# Altium footprint library ICs_rus.PCBLIB: 103 footprints (part 5 of 7)
Each footprint in its own frame and in the unit in brackets; x right, y up, seen from the top. Pads: shape width x height; smd on the part's side, far side on the other; paste and mask are expansions set on the pad; w line width, h text height; cw(c..) or ccw(c..) is an arc to the next point about the centre after c.
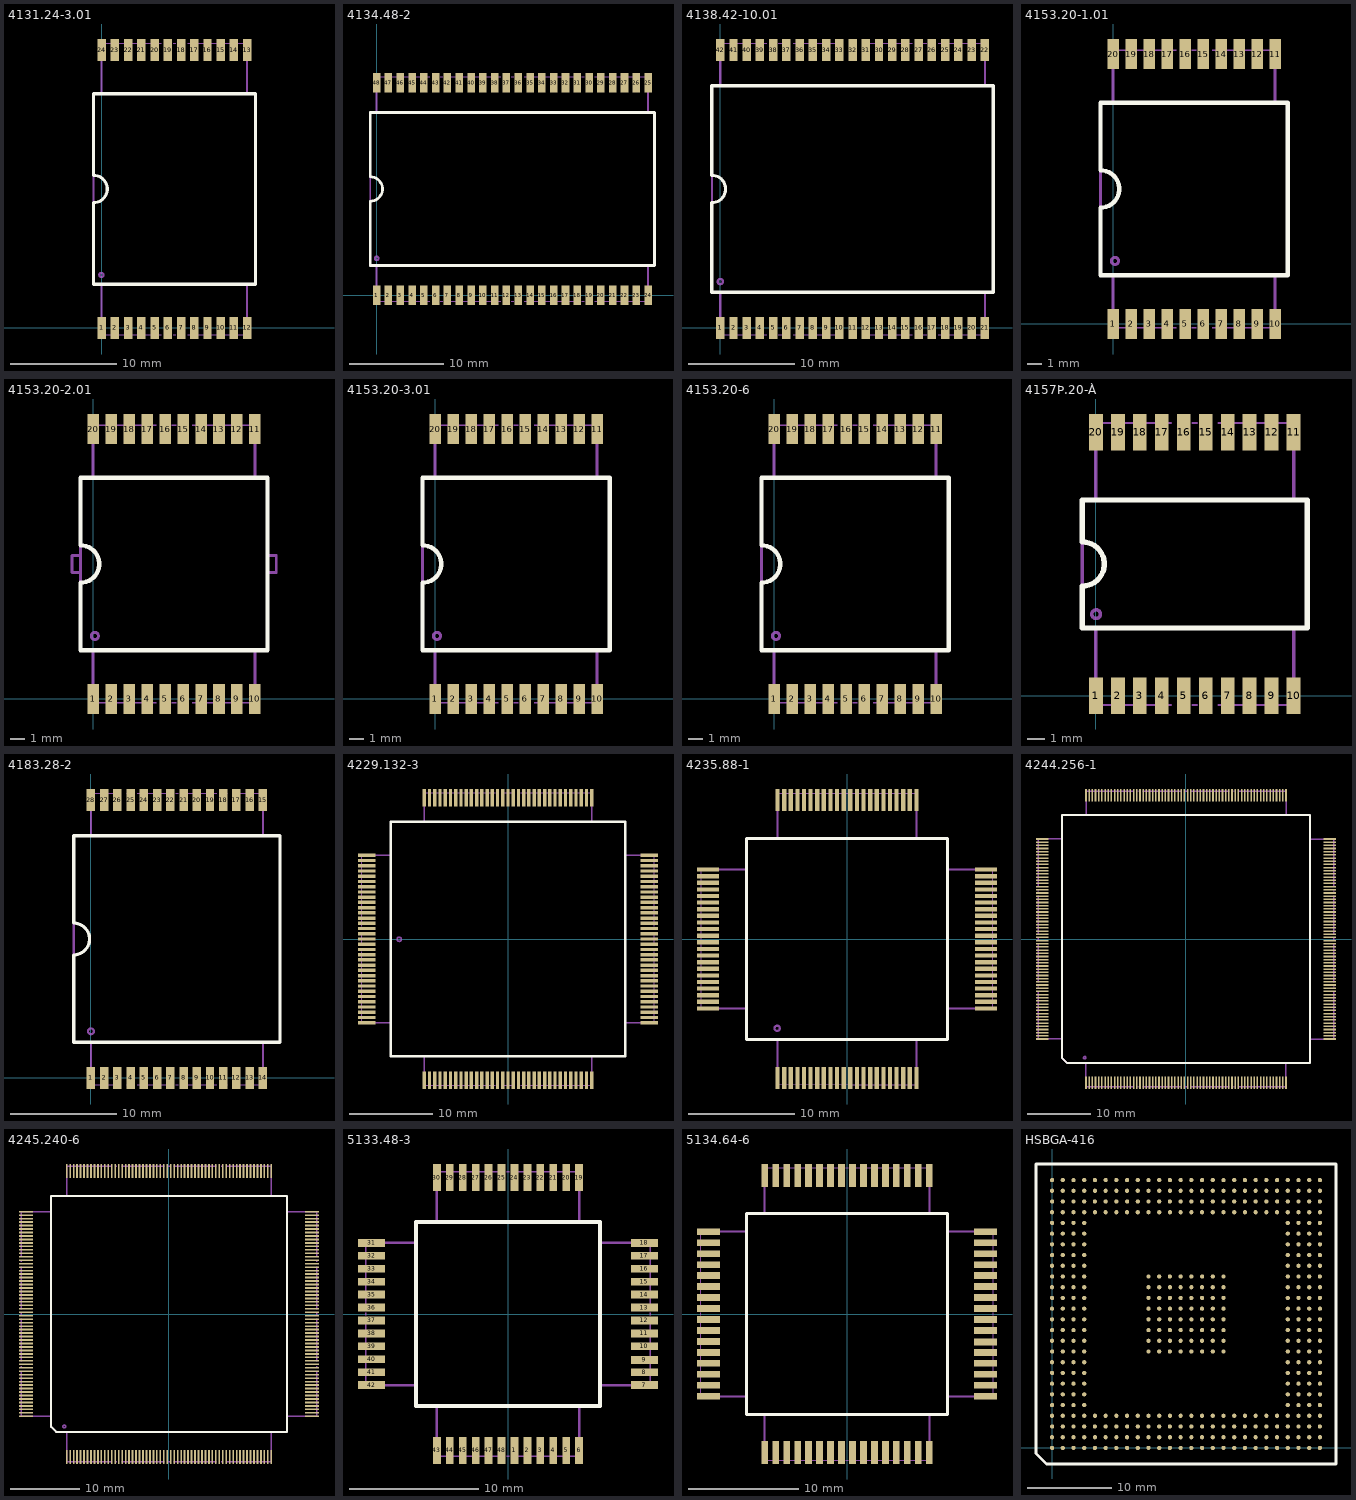
[diagram p4: the footprints below, top view; thin cyan lines are the x and y axes]

## 4131.24-3.01 [mm]
pads (24):
  rect 0.8x2.1 smd: 1(0,0) 2(1.25,0) 3(2.5,0) 4(3.75,0) 5(5,0) 6(6.25,0) 7(7.5,0) 8(8.75,0) 9(10,0) 10(11.25,0) 11(12.5,0) 12(13.75,0) 13(13.75,26.25) 14(12.5,26.25) 15(11.25,26.25) 16(10,26.25) 17(8.75,26.25) 18(7.5,26.25) 19(6.25,26.25) 20(5,26.25) 21(3.75,26.25) 22(2.5,26.25) 23(1.25,26.25) 24(0,26.25)
Top Overlay:
  lines w0.3: -0.775,4.125 14.525,4.125 14.525,22.125 -0.775,22.125 -0.775,14.425 cw(c-0.775,13.125) -0.775,11.825 -0.775,4.125
Mechanical 1:
  circle w0.2: c-0.025,5 r0.2
  lines w0.1: 0,-0.625 5.625,-0.625 ; 0,26.875 5.625,26.875 ; 6.75,-0.625 7,-0.625 ; 6.75,26.875 7,26.875 ; 8.125,-0.625 13.75,-0.625 ; 8.125,26.875 13.75,26.875
  lines w0.2: 0,-0.625 0,4.125 ; 0,22.125 0,26.875 ; 13.75,-0.625 13.75,4.125 ; 13.75,22.125 13.75,26.875 ; -0.775,4.125 14.525,4.125 14.525,22.125 -0.775,22.125 -0.775,4.125
  text ".Designator" at 5.5,14 h1.5
  text ".Comment" at 3.6,11.9 h1.5
  text "24" at 0.256,22.443 h1.5
3D body: height 3.35, standoff 0, extent -1,-0.6 14.75,26.9

## 4134.48-2 [mm]
pads (48):
  rect 0.8x2.1 smd: 1(0,0) 2(1.25,0) 3(2.5,0) 4(3.75,0) 5(5,0) 6(6.25,0) 7(7.5,0) 8(8.75,0) 9(10,0) 10(11.25,0) 11(12.5,0) 12(13.75,0) 13(15,0) 14(16.25,0) 15(17.5,0) 16(18.75,0) 17(20,0) 18(21.25,0) 19(22.5,0) 20(23.75,0) 21(25,0) 22(26.25,0) 23(27.5,0) 24(28.75,0) 25(28.75,22.5) 26(27.5,22.5) 27(26.25,22.5) 28(25,22.5) 29(23.75,22.5) 30(22.5,22.5) 31(21.25,22.5) 32(20,22.5) 33(18.75,22.5) 34(17.5,22.5) 35(16.25,22.5) 36(15,22.5) 37(13.75,22.5) 38(12.5,22.5) 39(11.25,22.5) 40(10,22.5) 41(8.75,22.5) 42(7.5,22.5) 43(6.25,22.5) 44(5,22.5) 45(3.75,22.5) 46(2.5,22.5) 47(1.25,22.5) 48(0,22.5)
Top Overlay:
  lines w0.3: -0.675,3.15 -0.675,9.95 ccw(c-0.675,11.25) -0.675,12.55 -0.675,19.35 29.425,19.35 29.425,3.15 -0.675,3.15
Mechanical 1:
  circle w0.2: c0,3.9 r0.2
  lines w0.1: 0,-0.65 5.625,-0.65 ; 0,23.15 5.625,23.15 ; 6.75,-0.65 7,-0.65 ; 6.75,23.15 7,23.15 ; 7.5,-0.65 13.125,-0.65 ; 7.5,23.15 13.125,23.15 ; 14.25,-0.65 14.5,-0.65 ; 14.25,23.15 14.5,23.15 ; 15.625,-0.65 21.25,-0.65 ; 15.625,23.15 21.25,23.15 ; 21.75,-0.65 22,-0.65 ; 21.75,23.15 22,23.15 ; 23.125,-0.65 28.75,-0.65 ; 23.125,23.15 28.75,23.15
  lines w0.2: 0,-0.65 0,3.15 ; 0,19.35 0,23.15 ; 28.75,-0.65 28.75,3.15 ; 28.75,19.35 28.75,23.15 ; -0.675,3.15 -0.675,19.35 29.425,19.35 29.425,3.15 -0.675,3.15
  text "48" at 0.427,20.446 h1.5
  text ".Comment" at 10.4,9.9 h1.5
  text ".Designator" at 12.3,12 h1.5
3D body: height 3.2, standoff 0, extent -0.9,-0.7 29.51,23.1

## 4138.42-10.01 [mm]
pads (42):
  rect 0.8x2.1 smd: 1(0,0) 2(1.25,0) 3(2.5,0) 4(3.75,0) 5(5,0) 6(6.25,0) 7(7.5,0) 8(8.75,0) 9(10,0) 10(11.25,0) 11(12.5,0) 12(13.75,0) 13(15,0) 14(16.25,0) 15(17.5,0) 16(18.75,0) 17(20,0) 18(21.25,0) 19(22.5,0) 20(23.75,0) 21(25,0) 22(25,26.25) 23(23.75,26.25) 24(22.5,26.25) 25(21.25,26.25) 26(20,26.25) 27(18.75,26.25) 28(17.5,26.25) 29(16.25,26.25) 30(15,26.25) 31(13.75,26.25) 32(12.5,26.25) 33(11.25,26.25) 34(10,26.25) 35(8.75,26.25) 36(7.5,26.25) 37(6.25,26.25) 38(5,26.25) 39(3.75,26.25) 40(2.5,26.25) 41(1.25,26.25) 42(0,26.25)
Top Overlay:
  lines w0.3: -0.8,3.375 -0.8,11.825 ccw(c-0.8,13.125) -0.8,14.425 -0.8,22.875 25.8,22.875 25.8,3.375 -0.8,3.375
Mechanical 1:
  circle w0.2: c0,4.375 r0.25
  lines w0.1: 0,-0.65 4.4,-0.65 ; 0,26.9 4.4,26.9 ; 5.5,-0.65 5.8,-0.65 ; 5.5,26.9 5.8,26.9 ; 6.875,-0.65 11.25,-0.65 ; 6.875,26.9 11.25,26.9 ; 12.35,-0.65 12.65,-0.65 ; 12.35,26.9 12.65,26.9 ; 13.75,-0.65 18.125,-0.65 ; 13.75,26.9 18.125,26.9 ; 19.2,-0.65 19.5,-0.65 ; 19.2,26.9 19.5,26.9 ; 20.6,-0.65 25,-0.65 ; 20.6,26.9 25,26.9
  lines w0.2: -0.8,22.872 25.8,22.872 ; -0.8,22.875 -0.8,3.375 25.8,3.375 25.8,22.875 ; 0,-0.625 0,3.375 ; 0,22.875 0,26.875 ; 25,-0.625 25,3.375 ; 25,22.875 25,26.875
  text "42" at 0.8,24 h1.5
  text ".Comment" at 9.3,11.7 h1.5
  text ".Designator" at 11.2,13.8 h1.5
3D body: height 2.9, standoff 0, extent -0.8,-0.6 25.72,26.9

## 4153.20-1.01 [mm]
pads (20):
  rect 0.8x2.1 smd: 1(0,0) 2(1.25,0) 3(2.5,0) 4(3.75,0) 5(5,0) 6(6.25,0) 7(7.5,0) 8(8.75,0) 9(10,0) 10(11.25,0) 11(11.25,18.75) 12(10,18.75) 13(8.75,18.75) 14(7.5,18.75) 15(6.25,18.75) 16(5,18.75) 17(3.75,18.75) 18(2.5,18.75) 19(1.25,18.75) 20(0,18.75)
Top Overlay:
  lines w0.3: -0.875,3.375 -0.875,8.075 ccw(c-0.875,9.375) -0.875,10.675 -0.875,15.375 12.125,15.375 12.125,3.375 -0.875,3.375
Mechanical 1:
  circle w0.2: c0.125,4.375 r0.25
  lines w0.1: 0,-0.275 4.375,-0.275 ; 0,19.025 4.375,19.025 ; 5.475,-0.275 5.775,-0.275 ; 5.475,19.025 5.775,19.025 ; 6.875,-0.275 11.25,-0.275 ; 6.875,19.025 11.25,19.025
  lines w0.2: 0,-0.275 0,3.375 ; 0,15.375 0,19.025 ; 11.25,-0.275 11.25,3.375 ; 11.25,15.375 11.25,19.025 ; -0.875,3.375 -0.875,15.375 12.125,15.375 12.125,3.375 -0.875,3.375
  text ".Designator" at 4.5,10.1 h1.5
  text ".Comment" at 2.6,8 h1.5
  text "20" at 0.427,16.071 h1.5
3D body: height 3, standoff 0, extent -0.9,-0.2 12.1,19.1

## 4153.20-2.01 [mm]
pads (20):
  rect 0.8x2.1 smd: 1(0,0) 2(1.25,0) 3(2.5,0) 4(3.75,0) 5(5,0) 6(6.25,0) 7(7.5,0) 8(8.75,0) 9(10,0) 10(11.25,0) 11(11.25,18.75) 12(10,18.75) 13(8.75,18.75) 14(7.5,18.75) 15(6.25,18.75) 16(5,18.75) 17(3.75,18.75) 18(2.5,18.75) 19(1.25,18.75) 20(0,18.75)
Top Overlay:
  lines w0.3: -0.875,3.375 -0.875,8.075 ccw(c-0.875,9.375) -0.875,10.675 -0.875,15.375 12.125,15.375 12.125,3.375 -0.875,3.375
Mechanical 1:
  circle w0.2: c0.125,4.375 r0.25
  lines w0.1: 0,-0.275 4.375,-0.275 ; 0,19.025 4.375,19.025 ; 5.475,-0.275 5.775,-0.275 ; 5.475,19.025 5.775,19.025 ; 6.875,-0.275 11.25,-0.275 ; 6.875,19.025 11.25,19.025
  lines w0.2: -0.875,8.775 -1.475,8.775 -1.475,9.975 -0.875,9.975 ; 0,-0.275 0,3.375 ; 0,15.375 0,19.025 ; 11.25,-0.275 11.25,3.375 ; 11.25,15.375 11.25,19.025 ; 12.125,8.775 12.725,8.775 12.725,9.975 12.125,9.975 ; -0.875,3.375 -0.875,15.375 12.125,15.375 12.125,3.375 -0.875,3.375
  text ".Designator" at 4.3,10 h1.5
  text ".Comment" at 2.4,7.9 h1.5
  text "20" at 0.751,15.618 h1.5
3D body: height 3.03, standoff 0, extent -1.5,-0.2 12.7,19.1

## 4153.20-3.01 [mm]
pads (20):
  rect 0.8x2.1 smd: 1(0,0) 2(1.25,0) 3(2.5,0) 4(3.75,0) 5(5,0) 6(6.25,0) 7(7.5,0) 8(8.75,0) 9(10,0) 10(11.25,0) 11(11.25,18.75) 12(10,18.75) 13(8.75,18.75) 14(7.5,18.75) 15(6.25,18.75) 16(5,18.75) 17(3.75,18.75) 18(2.5,18.75) 19(1.25,18.75) 20(0,18.75)
Top Overlay:
  lines w0.3: -0.875,3.375 12.125,3.375 12.125,15.375 -0.875,15.375 -0.875,10.675 cw(c-0.875,9.375) -0.875,8.075 -0.875,3.375
Mechanical 1:
  circle w0.2: c0.125,4.375 r0.25
  lines w0.1: 0,-0.275 4.375,-0.275 ; 0,19.025 4.375,19.025 ; 5.475,-0.275 5.775,-0.275 ; 5.475,19.025 5.775,19.025 ; 6.875,-0.275 11.25,-0.275 ; 6.875,19.025 11.25,19.025
  lines w0.2: 0,-0.275 0,3.375 ; 0,15.375 0,19.025 ; 11.25,-0.275 11.25,3.375 ; 11.25,15.375 11.25,19.025 ; -0.875,3.375 12.125,3.375 12.125,15.375 -0.875,15.375 -0.875,3.375
  text ".Designator" at 4.6,10.3 h1.5
  text ".Comment" at 2.7,8.2 h1.5
  text "20" at 0.751,15.618 h1.5
3D body: height 3.21, standoff 0, extent -0.9,-0.3 12.1,19

## 4153.20-6 [mm]
pads (20):
  rect 0.8x2.1 smd: 1(0,0) 2(1.25,0) 3(2.5,0) 4(3.75,0) 5(5,0) 6(6.25,0) 7(7.5,0) 8(8.75,0) 9(10,0) 10(11.25,0) 11(11.25,18.75) 12(10,18.75) 13(8.75,18.75) 14(7.5,18.75) 15(6.25,18.75) 16(5,18.75) 17(3.75,18.75) 18(2.5,18.75) 19(1.25,18.75) 20(0,18.75)
Top Overlay:
  lines w0.3: -0.875,3.375 -0.875,8.075 ccw(c-0.875,9.375) -0.875,10.675 -0.875,15.375 12.125,15.375 12.125,3.375 -0.875,3.375
Mechanical 1:
  circle w0.2: c0.125,4.375 r0.25
  lines w0.1: 0,-0.275 4.375,-0.275 ; 0,19.025 4.375,19.025 ; 5.475,-0.275 5.775,-0.275 ; 5.475,19.025 5.775,19.025 ; 6.875,-0.275 11.25,-0.275 ; 6.875,19.025 11.25,19.025
  lines w0.2: 0,-0.275 0,3.375 ; 0,15.375 0,19.025 ; 11.25,-0.275 11.25,3.375 ; 11.25,15.375 11.25,19.025 ; -0.875,3.375 -0.875,15.375 12.125,15.375 12.125,3.375 -0.875,3.375
  text "20" at 0.427,16.071 h1.5
  text ".Comment" at 2.7,8 h1.5
  text ".Designator" at 4.6,10.1 h1.5
3D body: height 2.9, standoff 0, extent -0.9,-0.3 12.1,19

## 4157Þ.20-À [mm]
pads (20):
  rect 0.8x2.1 smd: 1(0,0) 2(1.27,0) 3(2.54,0) 4(3.81,0) 5(5.08,0) 6(6.35,0) 7(7.62,0) 8(8.89,0) 9(10.16,0) 10(11.43,0) 11(11.43,15.24) 12(10.16,15.24) 13(8.89,15.24) 14(7.62,15.24) 15(6.35,15.24) 16(5.08,15.24) 17(3.81,15.24) 18(2.54,15.24) 19(1.27,15.24) 20(0,15.24)
Top Overlay:
  lines w0.3: -0.785,6.32 -0.785,3.92 12.215,3.92 12.215,11.32 -0.785,11.32 -0.785,8.92 ; -0.785,6.345 ccw(c-0.785,7.62) -0.785,8.895
Mechanical 1:
  circle w0.2: c0.015,4.72 r0.25
  lines w0.1: 0.015,-0.53 4.34,-0.53 ; 0.015,15.77 4.34,15.77 ; 5.59,-0.53 5.84,-0.53 ; 5.59,15.77 5.84,15.77 ; 7.09,-0.53 11.415,-0.53 ; 7.09,15.77 11.415,15.77
  lines w0.2: 0,-0.51 0,3.915 ; 0,11.325 0,15.75 ; 11.43,-0.51 11.43,3.915 ; 11.43,11.325 11.43,15.75 ; -0.785,3.92 12.215,3.92 12.215,11.32 -0.785,11.32 -0.785,3.92
  text ".Designator" at 4.8,8.3 h1.5
  text ".Comment" at 2.9,6.2 h1.5
  text "20" at 0.508,12.827 h1.5

## 4183.28-2 [mm]
pads (28):
  rect 0.8x2.1 smd: 1(0,0) 2(1.25,0) 3(2.5,0) 4(3.75,0) 5(5,0) 6(6.25,0) 7(7.5,0) 8(8.75,0) 9(10,0) 10(11.25,0) 11(12.5,0) 12(13.75,0) 13(15,0) 14(16.25,0) 15(16.25,26.25) 16(15,26.25) 17(13.75,26.25) 18(12.5,26.25) 19(11.25,26.25) 20(10,26.25) 21(8.75,26.25) 22(7.5,26.25) 23(6.25,26.25) 24(5,26.25) 25(3.75,26.25) 26(2.5,26.25) 27(1.25,26.25) 28(0,26.25)
Top Overlay:
  lines w0.3: -1.625,3.375 17.875,3.375 17.875,22.875 -1.625,22.875 -1.625,14.625 cw(c-1.625,13.125) -1.625,11.625 -1.625,3.375
Mechanical 1:
  circle w0.2: c0,4.4 r0.275
  lines w0.1: 0,-0.625 2.625,-0.625 ; 0,26.875 2.625,26.875 ; 3.375,-0.625 3.625,-0.625 ; 3.375,26.875 3.625,26.875 ; 4.375,-0.625 7.125,-0.625 ; 4.375,26.875 7.125,26.875 ; 8,-0.625 8.25,-0.625 ; 8,26.875 8.25,26.875 ; 9.125,-0.625 11.875,-0.625 ; 9.125,26.875 11.875,26.875 ; 12.625,-0.625 12.875,-0.625 ; 12.625,26.875 12.875,26.875 ; 13.625,-0.625 16.25,-0.625 ; 13.625,26.875 16.25,26.875
  lines w0.2: 0,-0.625 0,3.375 ; 0,22.875 0,26.875 ; 16.25,-0.625 16.25,3.375 ; 16.25,22.875 16.25,26.875 ; -1.625,3.375 17.875,3.375 17.875,22.875 -1.625,22.875 -1.625,3.375
  text "28" at -1.124,19.993 h1.5
  text ".Comment" at 4.5,12 h1.5
  text ".Designator" at 6.4,14.1 h1.5
3D body: height 3, standoff 0, extent -1.6,-0.6 17.9,26.9

## 4229.132-3 [mm]
pads (132):
  rect 2.1x0.4 smd: 1(-16.875,0) 2(-16.875,-0.625) 3(-16.875,-1.25) 4(-16.875,-1.875) 5(-16.875,-2.5) 6(-16.875,-3.125) 7(-16.875,-3.75) 8(-16.875,-4.375) 9(-16.875,-5) 10(-16.875,-5.625) 11(-16.875,-6.25) 12(-16.875,-6.875) 13(-16.875,-7.5) 14(-16.875,-8.125) 15(-16.875,-8.75) 16(-16.875,-9.375) 17(-16.875,-10) 51(16.875,-10) 52(16.875,-9.375) 53(16.875,-8.75) 54(16.875,-8.125) 55(16.875,-7.5) 56(16.875,-6.875) 57(16.875,-6.25) 58(16.875,-5.625) 59(16.875,-5) 60(16.875,-4.375) 61(16.875,-3.75) 62(16.875,-3.125) 63(16.875,-2.5) 64(16.875,-1.875) 65(16.875,-1.25) 66(16.875,-0.625) 67(16.875,0) 68(16.875,0.625) 69(16.875,1.25) 70(16.875,1.875) 71(16.875,2.5) 72(16.875,3.125) 73(16.875,3.75) 74(16.875,4.375) 75(16.875,5) 76(16.875,5.625) 77(16.875,6.25) 78(16.875,6.875) 79(16.875,7.5) 80(16.875,8.125) 81(16.875,8.75) 82(16.875,9.375) 83(16.875,10) 117(-16.875,10) 118(-16.875,9.375) 119(-16.875,8.75) 120(-16.875,8.125) 121(-16.875,7.5) 122(-16.875,6.875) 123(-16.875,6.25) 124(-16.875,5.625) 125(-16.875,5) 126(-16.875,4.375) 127(-16.875,3.75) 128(-16.875,3.125) 129(-16.875,2.5) 130(-16.875,1.875) 131(-16.875,1.25) 132(-16.875,0.625)
  rect 0.4x2.1 smd: 18(-10,-16.875) 19(-9.375,-16.875) 20(-8.75,-16.875) 21(-8.125,-16.875) 22(-7.5,-16.875) 23(-6.875,-16.875) 24(-6.25,-16.875) 25(-5.625,-16.875) 26(-5,-16.875) 27(-4.375,-16.875) 28(-3.75,-16.875) 29(-3.125,-16.875) 30(-2.5,-16.875) 31(-1.875,-16.875) 32(-1.25,-16.875) 33(-0.625,-16.875) 34(0,-16.875) 35(0.625,-16.875) 36(1.25,-16.875) 37(1.875,-16.875) 38(2.5,-16.875) 39(3.125,-16.875) 40(3.75,-16.875) 41(4.375,-16.875) 42(5,-16.875) 43(5.625,-16.875) 44(6.25,-16.875) 45(6.875,-16.875) 46(7.5,-16.875) 47(8.125,-16.875) 48(8.75,-16.875) 49(9.375,-16.875) 50(10,-16.875) 84(10,16.875) 85(9.375,16.875) 86(8.75,16.875) 87(8.125,16.875) 88(7.5,16.875) 89(6.875,16.875) 90(6.25,16.875) 91(5.625,16.875) 92(5,16.875) 93(4.375,16.875) 94(3.75,16.875) 95(3.125,16.875) 96(2.5,16.875) 97(1.875,16.875) 98(1.25,16.875) 99(0.625,16.875) 100(0,16.875) 101(-0.625,16.875) 102(-1.25,16.875) 103(-1.875,16.875) 104(-2.5,16.875) 105(-3.125,16.875) 106(-3.75,16.875) 107(-4.375,16.875) 108(-5,16.875) 109(-5.625,16.875) 110(-6.25,16.875) 111(-6.875,16.875) 112(-7.5,16.875) 113(-8.125,16.875) 114(-8.75,16.875) 115(-9.375,16.875) 116(-10,16.875)
Top Overlay:
  lines w0.3: -14,-14 -14,14 14,14 14,-14 -14,-14
Mechanical 1:
  circle w0.2: c-13,-0.04 r0.25
  lines w0.1: -17.5,-10 -17.5,-1.5 ; -17.5,-0.5 -17.5,0.5 ; -17.5,1.5 -17.5,10 ; -10,-17.5 -1.5,-17.5 ; -10,17.5 -1.5,17.5 ; -0.5,-17.5 0.5,-17.5 ; -0.5,17.5 0.5,17.5 ; 1.5,-17.5 10,-17.5 ; 1.5,17.5 10,17.5 ; 17.5,-10 17.5,-1.5 ; 17.5,-0.5 17.5,0.5 ; 17.5,1.5 17.5,10
  lines w0.2: -17.5,-10 -14,-10 ; -17.5,10 -14,10 ; -10,-17.5 -10,-14 ; -10,14 -10,17.5 ; 10,-17.5 10,-14 ; 10,14 10,17.5 ; 14,-10 17.5,-10 ; 14,10 17.5,10 ; -14,-14 -14,14 14,14 14,-14 -14,-14
  text "17" at -13.3,-10.8 h1.5
  text "117" at -13.3,9.6 h1.5
  text "50" at 9.352,-13.304 h1.5
  text "84" at 9.352,11.696 h1.5
  text "132" at -13,0.8 h1.5
  text "18" at -10.648,-13.304 h1.5
  text "116" at -12.172,11.696 h1.5
  text "51" at 11.852,-10.804 h1.5
  text "83" at 11.852,9.196 h1.5
  text ".Comment" at -3.6,-0.6 h1.5
  text ".Designator" at -1.7,1.5 h1.5
3D body: height 3.4, standoff 0, extent -17.5,-17.5 17.5,17.5

## 4235.88-1 [mm]
pads (88):
  rect 0.4x2.1 smd: 1(-6.562,-13.125) 2(-5.937,-13.125) 3(-5.312,-13.125) 4(-4.687,-13.125) 5(-4.062,-13.125) 6(-3.437,-13.125) 7(-2.812,-13.125) 8(-2.187,-13.125) 9(-1.562,-13.125) 10(-0.937,-13.125) 11(-0.312,-13.125) 12(0.313,-13.125) 13(0.938,-13.125) 14(1.563,-13.125) 15(2.188,-13.125) 16(2.813,-13.125) 17(3.438,-13.125) 18(4.063,-13.125) 19(4.688,-13.125) 20(5.313,-13.125) 21(5.938,-13.125) 22(6.563,-13.125) 45(6.563,13.125) 46(5.938,13.125) 47(5.313,13.125) 48(4.688,13.125) 49(4.063,13.125) 50(3.438,13.125) 51(2.813,13.125) 52(2.188,13.125) 53(1.563,13.125) 54(0.938,13.125) 55(0.313,13.125) 56(-0.312,13.125) 57(-0.937,13.125) 58(-1.562,13.125) 59(-2.187,13.125) 60(-2.812,13.125) 61(-3.437,13.125) 62(-4.062,13.125) 63(-4.687,13.125) 64(-5.312,13.125) 65(-5.937,13.125) 66(-6.562,13.125)
  rect 2.1x0.4 smd: 23(13.125,-6.562) 24(13.125,-5.937) 25(13.125,-5.312) 26(13.125,-4.687) 27(13.125,-4.062) 28(13.125,-3.437) 29(13.125,-2.812) 30(13.125,-2.187) 31(13.125,-1.562) 32(13.125,-0.937) 33(13.125,-0.312) 34(13.125,0.313) 35(13.125,0.938) 36(13.125,1.563) 37(13.125,2.188) 38(13.125,2.813) 39(13.125,3.438) 40(13.125,4.063) 41(13.125,4.688) 42(13.125,5.313) 43(13.125,5.938) 44(13.125,6.563) 67(-13.125,6.563) 68(-13.125,5.938) 69(-13.125,5.313) 70(-13.125,4.688) 71(-13.125,4.063) 72(-13.125,3.438) 73(-13.125,2.813) 74(-13.125,2.188) 75(-13.125,1.563) 76(-13.125,0.938) 77(-13.125,0.313) 78(-13.125,-0.312) 79(-13.125,-0.937) 80(-13.125,-1.562) 81(-13.125,-2.187) 82(-13.125,-2.812) 83(-13.125,-3.437) 84(-13.125,-4.062) 85(-13.125,-4.687) 86(-13.125,-5.312) 87(-13.125,-5.937) 88(-13.125,-6.562)
Top Overlay:
  lines w0.3: -9.5,-9.5 -9.5,9.5 9.5,9.5 9.5,-9.5 -9.5,-9.5
Mechanical 1:
  circle w0.2: c-6.6,-8.44 r0.25
  lines w0.1: -13.75,-6.562 -13.75,-0.5 ; -13.75,-0.12 -13.75,0.12 ; -13.75,0.5 -13.75,6.562 ; -6.563,-13.747 -0.5,-13.75 ; -6.562,13.75 -0.498,13.752 ; -0.12,-13.749 0.12,-13.75 ; -0.12,13.75 0.12,13.75 ; 0.5,-13.75 6.562,-13.75 ; 0.5,13.75 6.562,13.75 ; 13.75,-6.562 13.75,-0.5 ; 13.75,-0.12 13.75,0.12 ; 13.75,0.5 13.75,6.562
  lines w0.2: -13.75,-6.562 -9.5,-6.562 ; -13.75,6.562 -9.5,6.562 ; -6.562,-9.5 -6.561,-13.75 ; -6.562,9.5 -6.562,13.75 ; 6.56,-13.748 6.562,-9.5 ; 6.562,9.5 6.562,13.75 ; 9.5,-6.562 13.75,-6.562 ; 9.5,6.562 13.75,6.562 ; -9.5,-9.5 -9.5,9.5 9.5,9.5 9.5,-9.5 -9.5,-9.5
  text ".Designator" at -1.1,0.9 h1.5
  text ".Comment" at -3,-1.2 h1.5
  text "22" at 6.052,-8.804 h1.5
  text "23" at 7.5,-7 h1.5
  text "44" at 7.6,6.1 h1.5
  text "45" at 5.8,8.2 h1.5
  text "66" at -7.1,8 h1.5
  text "67" at -8.8,6.2 h1.5
  text "88" at -8.9,-6.9 h1.5
3D body: height 3.1, standoff 0, extent -13.7,-13.7 13.8,13.8

## 4244.256-1 [mm]
pads (256):
  rect 0.25x2 smd: 1(-15.75,-22.625) 2(-15.25,-22.625) 3(-14.75,-22.625) 4(-14.25,-22.625) 5(-13.75,-22.625) 6(-13.25,-22.625) 7(-12.75,-22.625) 8(-12.25,-22.625) 9(-11.75,-22.625) 10(-11.25,-22.625) 11(-10.75,-22.625) 12(-10.25,-22.625) 13(-9.75,-22.625) 14(-9.25,-22.625) 15(-8.75,-22.625) 16(-8.25,-22.625) 17(-7.75,-22.625) 18(-7.25,-22.625) 19(-6.75,-22.625) 20(-6.25,-22.625) 21(-5.75,-22.625) 22(-5.25,-22.625) 23(-4.75,-22.625) 24(-4.25,-22.625) 25(-3.75,-22.625) 26(-3.25,-22.625) 27(-2.75,-22.625) 28(-2.25,-22.625) 29(-1.75,-22.625) 30(-1.25,-22.625) 31(-0.75,-22.625) 32(-0.25,-22.625) 33(0.25,-22.625) 34(0.75,-22.625) 35(1.25,-22.625) 36(1.75,-22.625) 37(2.25,-22.625) 38(2.75,-22.625) 39(3.25,-22.625) 40(3.75,-22.625) 41(4.25,-22.625) 42(4.75,-22.625) 43(5.25,-22.625) 44(5.75,-22.625) 45(6.25,-22.625) 46(6.75,-22.625) 47(7.25,-22.625) 48(7.75,-22.625) 49(8.25,-22.625) 50(8.75,-22.625) 51(9.25,-22.625) 52(9.75,-22.625) 53(10.25,-22.625) 54(10.75,-22.625) 55(11.25,-22.625) 56(11.75,-22.625) 57(12.25,-22.625) 58(12.75,-22.625) 59(13.25,-22.625) 60(13.75,-22.625) 61(14.25,-22.625) 62(14.75,-22.625) 63(15.25,-22.625) 64(15.75,-22.625) 129(15.75,22.625) 130(15.25,22.625) 131(14.75,22.625) 132(14.25,22.625) 133(13.75,22.625) 134(13.25,22.625) 135(12.75,22.625) 136(12.25,22.625) 137(11.75,22.625) 138(11.25,22.625) 139(10.75,22.625) 140(10.25,22.625) 141(9.75,22.625) 142(9.25,22.625) 143(8.75,22.625) 144(8.25,22.625) 145(7.75,22.625) 146(7.25,22.625) 147(6.75,22.625) 148(6.25,22.625) 149(5.75,22.625) 150(5.25,22.625) 151(4.75,22.625) 152(4.25,22.625) 153(3.75,22.625) 154(3.25,22.625) 155(2.75,22.625) 156(2.25,22.625) 157(1.75,22.625) 158(1.25,22.625) 159(0.75,22.625) 160(0.25,22.625) 161(-0.25,22.625) 162(-0.75,22.625) 163(-1.25,22.625) 164(-1.75,22.625) 165(-2.25,22.625) 166(-2.75,22.625) 167(-3.25,22.625) 168(-3.75,22.625) 169(-4.25,22.625) 170(-4.75,22.625) 171(-5.25,22.625) 172(-5.75,22.625) 173(-6.25,22.625) 174(-6.75,22.625) 175(-7.25,22.625) 176(-7.75,22.625) 177(-8.25,22.625) 178(-8.75,22.625) 179(-9.25,22.625) 180(-9.75,22.625) 181(-10.25,22.625) 182(-10.75,22.625) 183(-11.25,22.625) 184(-11.75,22.625) 185(-12.25,22.625) 186(-12.75,22.625) 187(-13.25,22.625) 188(-13.75,22.625) 189(-14.25,22.625) 190(-14.75,22.625) 191(-15.25,22.625) 192(-15.75,22.625)
  rect 2x0.25 smd: 65(22.625,-15.75) 66(22.625,-15.25) 67(22.625,-14.75) 68(22.625,-14.25) 69(22.625,-13.75) 70(22.625,-13.25) 71(22.625,-12.75) 72(22.625,-12.25) 73(22.625,-11.75) 74(22.625,-11.25) 75(22.625,-10.75) 76(22.625,-10.25) 77(22.625,-9.75) 78(22.625,-9.25) 79(22.625,-8.75) 80(22.625,-8.25) 81(22.625,-7.75) 82(22.625,-7.25) 83(22.625,-6.75) 84(22.625,-6.25) 85(22.625,-5.75) 86(22.625,-5.25) 87(22.625,-4.75) 88(22.625,-4.25) 89(22.625,-3.75) 90(22.625,-3.25) 91(22.625,-2.75) 92(22.625,-2.25) 93(22.625,-1.75) 94(22.625,-1.25) 95(22.625,-0.75) 96(22.625,-0.25) 97(22.625,0.25) 98(22.625,0.75) 99(22.625,1.25) 100(22.625,1.75) 101(22.625,2.25) 102(22.625,2.75) 103(22.625,3.25) 104(22.625,3.75) 105(22.625,4.25) 106(22.625,4.75) 107(22.625,5.25) 108(22.625,5.75) 109(22.625,6.25) 110(22.625,6.75) 111(22.625,7.25) 112(22.625,7.75) 113(22.625,8.25) 114(22.625,8.75) 115(22.625,9.25) 116(22.625,9.75) 117(22.625,10.25) 118(22.625,10.75) 119(22.625,11.25) 120(22.625,11.75) 121(22.625,12.25) 122(22.625,12.75) 123(22.625,13.25) 124(22.625,13.75) 125(22.625,14.25) 126(22.625,14.75) 127(22.625,15.25) 128(22.625,15.75) 193(-22.625,15.75) 194(-22.625,15.25) 195(-22.625,14.75) 196(-22.625,14.25) 197(-22.625,13.75) 198(-22.625,13.25) 199(-22.625,12.75) 200(-22.625,12.25) 201(-22.625,11.75) 202(-22.625,11.25) 203(-22.625,10.75) 204(-22.625,10.25) 205(-22.625,9.75) 206(-22.625,9.25) 207(-22.625,8.75) 208(-22.625,8.25) 209(-22.625,7.75) 210(-22.625,7.25) 211(-22.625,6.75) 212(-22.625,6.25) 213(-22.625,5.75) 214(-22.625,5.25) 215(-22.625,4.75) 216(-22.625,4.25) 217(-22.625,3.75) 218(-22.625,3.25) 219(-22.625,2.75) 220(-22.625,2.25) 221(-22.625,1.75) 222(-22.625,1.25) 223(-22.625,0.75) 224(-22.625,0.25) 225(-22.625,-0.25) 226(-22.625,-0.75) 227(-22.625,-1.25) 228(-22.625,-1.75) 229(-22.625,-2.25) 230(-22.625,-2.75) 231(-22.625,-3.25) 232(-22.625,-3.75) 233(-22.625,-4.25) 234(-22.625,-4.75) 235(-22.625,-5.25) 236(-22.625,-5.75) 237(-22.625,-6.25) 238(-22.625,-6.75) 239(-22.625,-7.25) 240(-22.625,-7.75) 241(-22.625,-8.25) 242(-22.625,-8.75) 243(-22.625,-9.25) 244(-22.625,-9.75) 245(-22.625,-10.25) 246(-22.625,-10.75) 247(-22.625,-11.25) 248(-22.625,-11.75) 249(-22.625,-12.25) 250(-22.625,-12.75) 251(-22.625,-13.25) 252(-22.625,-13.75) 253(-22.625,-14.25) 254(-22.625,-14.75) 255(-22.625,-15.25) 256(-22.625,-15.75)
Top Overlay:
  lines w0.3: 19.5,19.5 -19.5,19.5 -19.5,-18.75 -18.75,-19.5 19.5,-19.5 19.5,19.5 ; 19.5,19.5 19.5,19.5
Mechanical 1:
  lines w0.2: -23.251,-8.3 -23.261,-15.75 -19.5,-15.75 ; -23.251,8.3 -23.261,15.751 -19.5,15.751 ; -23.25,-7.6 -23.25,-7.5 ; -23.25,-6.8 -23.25,-0.7 ; -23.25,-0.1 -23.25,0.1 ; -23.25,0.7 -23.25,6.8 ; -23.25,7.5 -23.25,7.6 ; -15.751,-19.5 -15.751,-23.261 -8.3,-23.251 ; -15.75,19.5 -15.75,23.261 -8.3,23.251 ; -7.6,-23.25 -7.5,-23.25 ; -7.6,23.25 -7.5,23.25 ; -6.8,-23.25 -0.7,-23.25 ; -6.8,23.25 -0.7,23.25 ; -0.1,-23.25 0.1,-23.25 ; -0.1,23.25 0.1,23.25 ; 0.7,-23.25 6.8,-23.25 ; 0.7,23.25 6.8,23.25 ; 7.5,-23.25 7.6,-23.25 ; 7.5,23.25 7.6,23.25 ; 8.3,-23.251 15.75,-23.261 15.75,-19.5 ; 8.3,23.251 15.751,23.261 15.751,19.5 ; 19.5,-15.751 23.261,-15.751 23.251,-8.3 ; 19.5,15.75 23.261,15.75 23.251,8.3 ; 23.25,-7.6 23.25,-7.5 ; 23.25,-6.8 23.25,-0.7 ; 23.25,-0.1 23.25,0.1 ; 23.25,0.7 23.25,6.8 ; 23.25,7.5 23.25,7.6 ; -19.5,-18.75 -18.75,-19.5 19.5,-19.5 19.5,19.5 -19.5,19.5 -19.5,-18.75 ; -15.75,-18.7 ccw(c-15.95,-18.7) -15.75,-18.7
  text ".Designator" at -1.43,0.905 h1.5
  text ".Comment" at -3.02,-0.795 h1.5
  text "256" at -18.55,-15.95 h1.5

## 4245.240-6 [mm]
height 4.3
pads (240):
  rect 0.25x2 smd: 1(-14.75,-20.625) 2(-14.25,-20.625) 3(-13.75,-20.625) 4(-13.25,-20.625) 5(-12.75,-20.625) 6(-12.25,-20.625) 7(-11.75,-20.625) 8(-11.25,-20.625) 9(-10.75,-20.625) 10(-10.25,-20.625) 11(-9.75,-20.625) 12(-9.25,-20.625) 13(-8.75,-20.625) 14(-8.25,-20.625) 15(-7.75,-20.625) 16(-7.25,-20.625) 17(-6.75,-20.625) 18(-6.25,-20.625) 19(-5.75,-20.625) 20(-5.25,-20.625) 21(-4.75,-20.625) 22(-4.25,-20.625) 23(-3.75,-20.625) 24(-3.25,-20.625) 25(-2.75,-20.625) 26(-2.25,-20.625) 27(-1.75,-20.625) 28(-1.25,-20.625) 29(-0.75,-20.625) 30(-0.25,-20.625) 31(0.25,-20.625) 32(0.75,-20.625) 33(1.25,-20.625) 34(1.75,-20.625) 35(2.25,-20.625) 36(2.75,-20.625) 37(3.25,-20.625) 38(3.75,-20.625) 39(4.25,-20.625) 40(4.75,-20.625) 41(5.25,-20.625) 42(5.75,-20.625) 43(6.25,-20.625) 44(6.75,-20.625) 45(7.25,-20.625) 46(7.75,-20.625) 47(8.25,-20.625) 48(8.75,-20.625) 49(9.25,-20.625) 50(9.75,-20.625) 51(10.25,-20.625) 52(10.75,-20.625) 53(11.25,-20.625) 54(11.75,-20.625) 55(12.25,-20.625) 56(12.75,-20.625) 57(13.25,-20.625) 58(13.75,-20.625) 59(14.25,-20.625) 60(14.75,-20.625) 121(14.75,20.625) 122(14.25,20.625) 123(13.75,20.625) 124(13.25,20.625) 125(12.75,20.625) 126(12.25,20.625) 127(11.75,20.625) 128(11.25,20.625) 129(10.75,20.625) 130(10.25,20.625) 131(9.75,20.625) 132(9.25,20.625) 133(8.75,20.625) 134(8.25,20.625) 135(7.75,20.625) 136(7.25,20.625) 137(6.75,20.625) 138(6.25,20.625) 139(5.75,20.625) 140(5.25,20.625) 141(4.75,20.625) 142(4.25,20.625) 143(3.75,20.625) 144(3.25,20.625) 145(2.75,20.625) 146(2.25,20.625) 147(1.75,20.625) 148(1.25,20.625) 149(0.75,20.625) 150(0.25,20.625) 151(-0.25,20.625) 152(-0.75,20.625) 153(-1.25,20.625) 154(-1.75,20.625) 155(-2.25,20.625) 156(-2.75,20.625) 157(-3.25,20.625) 158(-3.75,20.625) 159(-4.25,20.625) 160(-4.75,20.625) 161(-5.25,20.625) 162(-5.75,20.625) 163(-6.25,20.625) 164(-6.75,20.625) 165(-7.25,20.625) 166(-7.75,20.625) 167(-8.25,20.625) 168(-8.75,20.625) 169(-9.25,20.625) 170(-9.75,20.625) 171(-10.25,20.625) 172(-10.75,20.625) 173(-11.25,20.625) 174(-11.75,20.625) 175(-12.25,20.625) 176(-12.75,20.625) 177(-13.25,20.625) 178(-13.75,20.625) 179(-14.25,20.625) 180(-14.75,20.625)
  rect 2x0.25 smd: 61(20.625,-14.75) 62(20.625,-14.25) 63(20.625,-13.75) 64(20.625,-13.25) 65(20.625,-12.75) 66(20.625,-12.25) 67(20.625,-11.75) 68(20.625,-11.25) 69(20.625,-10.75) 70(20.625,-10.25) 71(20.625,-9.75) 72(20.625,-9.25) 73(20.625,-8.75) 74(20.625,-8.25) 75(20.625,-7.75) 76(20.625,-7.25) 77(20.625,-6.75) 78(20.625,-6.25) 79(20.625,-5.75) 80(20.625,-5.25) 81(20.625,-4.75) 82(20.625,-4.25) 83(20.625,-3.75) 84(20.625,-3.25) 85(20.625,-2.75) 86(20.625,-2.25) 87(20.625,-1.75) 88(20.625,-1.25) 89(20.625,-0.75) 90(20.625,-0.25) 91(20.625,0.25) 92(20.625,0.75) 93(20.625,1.25) 94(20.625,1.75) 95(20.625,2.25) 96(20.625,2.75) 97(20.625,3.25) 98(20.625,3.75) 99(20.625,4.25) 100(20.625,4.75) 101(20.625,5.25) 102(20.625,5.75) 103(20.625,6.25) 104(20.625,6.75) 105(20.625,7.25) 106(20.625,7.75) 107(20.625,8.25) 108(20.625,8.75) 109(20.625,9.25) 110(20.625,9.75) 111(20.625,10.25) 112(20.625,10.75) 113(20.625,11.25) 114(20.625,11.75) 115(20.625,12.25) 116(20.625,12.75) 117(20.625,13.25) 118(20.625,13.75) 119(20.625,14.25) 120(20.625,14.75) 181(-20.625,14.75) 182(-20.625,14.25) 183(-20.625,13.75) 184(-20.625,13.25) 185(-20.625,12.75) 186(-20.625,12.25) 187(-20.625,11.75) 188(-20.625,11.25) 189(-20.625,10.75) 190(-20.625,10.25) 191(-20.625,9.75) 192(-20.625,9.25) 193(-20.625,8.75) 194(-20.625,8.25) 195(-20.625,7.75) 196(-20.625,7.25) 197(-20.625,6.75) 198(-20.625,6.25) 199(-20.625,5.75) 200(-20.625,5.25) 201(-20.625,4.75) 202(-20.625,4.25) 203(-20.625,3.75) 204(-20.625,3.25) 205(-20.625,2.75) 206(-20.625,2.25) 207(-20.625,1.75) 208(-20.625,1.25) 209(-20.625,0.75) 210(-20.625,0.25) 211(-20.625,-0.25) 212(-20.625,-0.75) 213(-20.625,-1.25) 214(-20.625,-1.75) 215(-20.625,-2.25) 216(-20.625,-2.75) 217(-20.625,-3.25) 218(-20.625,-3.75) 219(-20.625,-4.25) 220(-20.625,-4.75) 221(-20.625,-5.25) 222(-20.625,-5.75) 223(-20.625,-6.25) 224(-20.625,-6.75) 225(-20.625,-7.25) 226(-20.625,-7.75) 227(-20.625,-8.25) 228(-20.625,-8.75) 229(-20.625,-9.25) 230(-20.625,-9.75) 231(-20.625,-10.25) 232(-20.625,-10.75) 233(-20.625,-11.25) 234(-20.625,-11.75) 235(-20.625,-12.25) 236(-20.625,-12.75) 237(-20.625,-13.25) 238(-20.625,-13.75) 239(-20.625,-14.25) 240(-20.625,-14.75)
Top Overlay:
  lines w0.3: -17,-16.25 -17,17 17,17 17,-17 -16.25,-17 -17,-16.25
Mechanical 1:
  lines w0.2: -21.31,-14.755 -21.301,-8.3 ; -21.301,8.3 -21.31,14.755 -17,14.75 ; -21.3,-7.6 -21.3,-7.5 ; -21.3,-6.8 -21.3,-0.7 ; -21.3,-0.1 -21.3,0.1 ; -21.3,0.7 -21.3,6.8 ; -21.3,7.5 -21.3,7.6 ; -21.25,-14.75 -17,-14.75 ; -14.755,-21.31 -8.3,-21.301 ; -14.755,17 -14.755,21.31 -8.3,21.301 ; -14.75,-21.31 -14.75,-17 ; -7.6,-21.3 -7.5,-21.3 ; -7.6,21.3 -7.5,21.3 ; -6.8,-21.3 -0.7,-21.3 ; -6.8,21.3 -0.7,21.3 ; -0.1,-21.3 0.1,-21.3 ; -0.1,21.3 0.1,21.3 ; 0.7,-21.3 6.8,-21.3 ; 0.7,21.3 6.8,21.3 ; 7.5,-21.3 7.6,-21.3 ; 7.5,21.3 7.6,21.3 ; 8.3,-21.301 14.755,-21.31 ; 8.3,21.301 14.755,21.31 ; 14.75,-21.31 14.75,-17 ; 14.75,17 14.75,21.31 ; 17,-14.75 21.31,-14.755 21.301,-8.3 ; 17,14.75 21.31,14.745 ; 21.3,-7.6 21.3,-7.5 ; 21.3,-6.8 21.3,-0.7 ; 21.3,-0.1 21.3,0.1 ; 21.3,0.7 21.3,6.8 ; 21.3,7.5 21.3,7.6 ; 21.301,8.3 21.31,14.755 ; -17,-16.25 -17,17 17,17 17,-17 -16.25,-17 -17,-16.25 ; -14.9,-16.2 ccw(c-15.1,-16.2) -14.9,-16.2
  text "240" at -16.3,-14.7 h1.5
  text ".Comment" at -3.02,-0.795 h1.5
  text ".Designator" at -1.43,0.905 h1.5

## 5133.48-3 [mm]
pads (48):
  rect 0.6x2.1 smd: 1(0.5,-10.55) 2(1.5,-10.55) 3(2.5,-10.55) 4(3.5,-10.55) 5(4.5,-10.55) 6(5.5,-10.55) 19(5.5,10.55) 20(4.5,10.55) 21(3.5,10.55) 22(2.5,10.55) 23(1.5,10.55) 24(0.5,10.55) 25(-0.5,10.55) 26(-1.5,10.55) 27(-2.5,10.55) 28(-3.5,10.55) 29(-4.5,10.55) 30(-5.5,10.55) 43(-5.5,-10.55) 44(-4.5,-10.55) 45(-3.5,-10.55) 46(-2.5,-10.55) 47(-1.5,-10.55) 48(-0.5,-10.55)
  rect 2.1x0.6 smd: 7(10.55,-5.5) 8(10.55,-4.5) 9(10.55,-3.55) 10(10.55,-2.5) 11(10.55,-1.5) 12(10.55,-0.5) 13(10.55,0.5) 14(10.55,1.5) 15(10.55,2.5) 16(10.55,3.5) 17(10.55,4.5) 18(10.55,5.5) 31(-10.55,5.5) 32(-10.55,4.5) 33(-10.55,3.5) 34(-10.55,2.5) 35(-10.55,1.5) 36(-10.55,0.5) 37(-10.55,-0.5) 38(-10.55,-1.5) 39(-10.55,-2.5) 40(-10.55,-3.5) 41(-10.55,-4.5) 42(-10.55,-5.5)
Top Overlay:
  lines w0.3: -7.1,-7.1 -7.1,7.1 7.1,7.1 7.1,-7.1 -7.1,-7.1
Mechanical 1:
  lines w0.1: -11,-5.5 -11,-0.5 ; -11,-0.1 -11,0.1 ; -11,0.5 -11,5.5 ; -5.5,-11 -0.5,-11 ; -5.5,11 -0.5,11 ; -0.1,-11 0.1,-11 ; -0.1,11 0.1,11 ; 0.5,-11 5.5,-11 ; 0.5,11 5.5,11 ; 11,-5.5 11,-0.5 ; 11,-0.1 11,0.1 ; 11,0.5 11,5.5
  lines w0.2: -11,-5.5 -7.1,-5.5 ; -11,5.5 -7.1,5.5 ; -5.5,-11 -5.5,-7.1 ; -5.5,7.1 -5.5,11 ; 5.5,-11 5.5,-7.1 ; 5.5,7.1 5.5,11 ; 7.1,-5.5 11,-5.5 ; 7.1,5.5 11,5.5 ; -7.1,-7.1 -7.1,7.1 7.1,7.1 7.1,-7.1 -7.1,-7.1
  text ".Designator" at -1.2,0.6 h1.5
  text ".Comment" at -3.1,-1.5 h1.5
  text "42" at -6.243,-5.202 h1.5
  text "31" at -6.243,3.298 h1.5
  text "1" at 0.653,-6.622 h1.5
  text "48" at -1.743,-6.622 h1.5
  text "7" at 5.653,-5.122 h1.5
  text "18" at 4.757,3.298 h1.5
  text "30" at -4.743,5.298 h1.5
  text "19" at 3.757,5.298 h1.5

## 5134.64-6 [mm]
pads (64):
  rect 2.1x0.6 smd: 1(-12.6,-0.5) 2(-12.6,-1.5) 3(-12.6,-2.5) 4(-12.6,-3.5) 5(-12.6,-4.5) 6(-12.6,-5.5) 7(-12.6,-6.5) 8(-12.6,-7.5) 25(12.6,-7.5) 26(12.6,-6.5) 27(12.6,-5.5) 28(12.6,-4.5) 29(12.6,-3.5) 30(12.6,-2.55) 31(12.6,-1.5) 32(12.6,-0.5) 33(12.6,0.5) 34(12.6,1.5) 35(12.6,2.5) 36(12.6,3.5) 37(12.6,4.5) 38(12.6,5.5) 39(12.6,6.5) 40(12.6,7.5) 57(-12.6,7.5) 58(-12.6,6.5) 59(-12.6,5.5) 60(-12.6,4.5) 61(-12.6,3.5) 62(-12.6,2.5) 63(-12.6,1.5) 64(-12.6,0.5)
  rect 0.6x2.1 smd: 9(-7.5,-12.6) 10(-6.5,-12.6) 11(-5.5,-12.6) 12(-4.5,-12.6) 13(-3.5,-12.6) 14(-2.5,-12.6) 15(-1.5,-12.6) 16(-0.5,-12.6) 17(0.5,-12.6) 18(1.5,-12.6) 19(2.5,-12.6) 20(3.5,-12.6) 21(4.5,-12.6) 22(5.5,-12.6) 23(6.5,-12.6) 24(7.5,-12.6) 41(7.5,12.6) 42(6.5,12.6) 43(5.5,12.6) 44(4.5,12.6) 45(3.5,12.6) 46(2.5,12.6) 47(1.5,12.6) 48(0.5,12.6) 49(-0.5,12.6) 50(-1.5,12.6) 51(-2.5,12.6) 52(-3.5,12.6) 53(-4.5,12.6) 54(-5.5,12.6) 55(-6.5,12.6) 56(-7.5,12.6)
Top Overlay:
  lines w0.3: -9.15,-9.15 -9.15,9.15 9.15,9.15 9.15,-9.15 -9.15,-9.15
Mechanical 1:
  lines w0.1: -13.3,-7.5 -13.3,-0.5 ; -13.3,-0.1 -13.3,0.1 ; -13.3,0.5 -13.3,7.5 ; -7.5,-13.3 -0.5,-13.3 ; -7.5,13.3 -0.5,13.3 ; -0.1,-13.3 0.1,-13.3 ; -0.1,13.3 0.1,13.3 ; 0.5,-13.3 7.5,-13.3 ; 0.5,13.3 7.5,13.3 ; 13.3,-7.5 13.3,-0.5 ; 13.3,-0.1 13.3,0.1 ; 13.3,0.5 13.3,7.5
  lines w0.2: -13.3,-7.5 -9.15,-7.5 ; -13.3,7.5 -9.15,7.5 ; -7.5,-13.3 -7.5,-9.15 ; -7.5,9.15 -7.5,13.3 ; 7.5,-13.3 7.5,-9.15 ; 7.5,9.15 7.5,13.3 ; 9.15,-7.5 13.3,-7.5 ; 9.15,7.5 13.3,7.5 ; -9.15,-9.15 -9.15,9.15 9.15,9.15 9.15,-9.15 -9.15,-9.15
  text "8" at -8,-7.4 h1.5
  text "57" at -8.124,6.143 h1.5
  text "25" at 7.2,-7 h1.5
  text "40" at 7.1,6.1 h1.5
  text "64" at -8.124,-0.257 h1.5
  text "9" at -7.2,-8.6 h1.5
  text "1" at -7.728,-2.257 h1.5
  text "56" at -7.5,7.6 h1.5
  text "24" at 6.2,-8.6 h1.5
  text "41" at 6.6,7.6 h1.5
  text ".Comment" at -3,-1.5 h1.5
  text ".Designator" at -1.1,0.6 h1.5

## HSBGA-416 [mm]
pads (416):
  round 0.5 smd: A1(0,0) A2(0,1.27) A3(0,2.54) A4(0,3.81) A5(0,5.08) A6(0,6.35) A7(0,7.62) A8(0,8.89) A9(0,10.16) A10(0,11.43) A11(0,12.7) A12(0,13.97) A13(0,15.24) A14(0,16.51) A15(0,17.78) A16(0,19.05) A17(0,20.32) A18(0,21.59) A19(0,22.86) A20(0,24.13) A21(0,25.4) A22(0,26.67) A23(0,27.94) A24(0,29.21) A25(0,30.48) A26(0,31.75) AA1(25.4,0) AA2(25.4,1.27) AA3(25.4,2.54) AA4(25.4,3.81) AA23(25.4,27.94) AA24(25.4,29.21) AA25(25.4,30.48) AA26(25.4,31.75) AB1(26.67,0) AB2(26.67,1.27) AB3(26.67,2.54) AB4(26.67,3.81) AB23(26.67,27.94) AB24(26.67,29.21) AB25(26.67,30.48) AB26(26.67,31.75) AC1(27.94,0) AC2(27.94,1.27) AC3(27.94,2.54) AC4(27.94,3.81) AC5(27.94,5.08) AC6(27.94,6.35) AC7(27.94,7.62) AC8(27.94,8.89) AC9(27.94,10.16) AC10(27.94,11.43) AC11(27.94,12.7) AC12(27.94,13.97) AC13(27.94,15.24) AC14(27.94,16.51) AC15(27.94,17.78) AC16(27.94,19.05) AC17(27.94,20.32) AC18(27.94,21.59) AC19(27.94,22.86) AC20(27.94,24.13) AC21(27.94,25.4) AC22(27.94,26.67) AC23(27.94,27.94) AC24(27.94,29.21) AC25(27.94,30.48) AC26(27.94,31.75) AD1(29.21,0) AD2(29.21,1.27) AD3(29.21,2.54) AD4(29.21,3.81) AD5(29.21,5.08) AD6(29.21,6.35) AD7(29.21,7.62) AD8(29.21,8.89) AD9(29.21,10.16) AD10(29.21,11.43) AD11(29.21,12.7) AD12(29.21,13.97) AD13(29.21,15.24) AD14(29.21,16.51) AD15(29.21,17.78) AD16(29.21,19.05) AD17(29.21,20.32) AD18(29.21,21.59) AD19(29.21,22.86) AD20(29.21,24.13) AD21(29.21,25.4) AD22(29.21,26.67) AD23(29.21,27.94) AD24(29.21,29.21) AD25(29.21,30.48) AD26(29.21,31.75) AE1(30.48,0) AE2(30.48,1.27) AE3(30.48,2.54) AE4(30.48,3.81) AE5(30.48,5.08) AE6(30.48,6.35) AE7(30.48,7.62) AE8(30.48,8.89) AE9(30.48,10.16) AE10(30.48,11.43) AE11(30.48,12.7) AE12(30.48,13.97) AE13(30.48,15.24) AE14(30.48,16.51) AE15(30.48,17.78) AE16(30.48,19.05) AE17(30.48,20.32) AE18(30.48,21.59) AE19(30.48,22.86) AE20(30.48,24.13) AE21(30.48,25.4) AE22(30.48,26.67) AE23(30.48,27.94) AE24(30.48,29.21) AE25(30.48,30.48) AE26(30.48,31.75) AF1(31.75,0) AF2(31.75,1.27) AF3(31.75,2.54) AF4(31.75,3.81) AF5(31.75,5.08) AF6(31.75,6.35) AF7(31.75,7.62) AF8(31.75,8.89) AF9(31.75,10.16) AF10(31.75,11.43) AF11(31.75,12.7) AF12(31.75,13.97) AF13(31.75,15.24) AF14(31.75,16.51) AF15(31.75,17.78) AF16(31.75,19.05) AF17(31.75,20.32) AF18(31.75,21.59) AF19(31.75,22.86) AF20(31.75,24.13) AF21(31.75,25.4) AF22(31.75,26.67) AF23(31.75,27.94) AF24(31.75,29.21) AF25(31.75,30.48) AF26(31.75,31.75) B1(1.27,0) B2(1.27,1.27) B3(1.27,2.54) B4(1.27,3.81) B5(1.27,5.08) B6(1.27,6.35) B7(1.27,7.62) B8(1.27,8.89) B9(1.27,10.16) B10(1.27,11.43) B11(1.27,12.7) B12(1.27,13.97) B13(1.27,15.24) B14(1.27,16.51) B15(1.27,17.78) B16(1.27,19.05) B17(1.27,20.32) B18(1.27,21.59) B19(1.27,22.86) B20(1.27,24.13) B21(1.27,25.4) B22(1.27,26.67) B23(1.27,27.94) B24(1.27,29.21) B25(1.27,30.48) B26(1.27,31.75) C1(2.54,0) C2(2.54,1.27) C3(2.54,2.54) C4(2.54,3.81) C5(2.54,5.08) C6(2.54,6.35) C7(2.54,7.62) C8(2.54,8.89) C9(2.54,10.16) C10(2.54,11.43) C11(2.54,12.7) C12(2.54,13.97) C13(2.54,15.24) C14(2.54,16.51) C15(2.54,17.78) C16(2.54,19.05) C17(2.54,20.32) C18(2.54,21.59) C19(2.54,22.86) C20(2.54,24.13) C21(2.54,25.4) C22(2.54,26.67) C23(2.54,27.94) C24(2.54,29.21) C25(2.54,30.48) C26(2.54,31.75) D1(3.81,0) D2(3.81,1.27) D3(3.81,2.54) D4(3.81,3.81) D5(3.81,5.08) D6(3.81,6.35) D7(3.81,7.62) D8(3.81,8.89) D9(3.81,10.16) D10(3.81,11.43) D11(3.81,12.7) D12(3.81,13.97) D13(3.81,15.24) D14(3.81,16.51) D15(3.81,17.78) D16(3.81,19.05) D17(3.81,20.32) D18(3.81,21.59) D19(3.81,22.86) D20(3.81,24.13) D21(3.81,25.4) D22(3.81,26.67) D23(3.81,27.94) D24(3.81,29.21) D25(3.81,30.48) D26(3.81,31.75) E1(5.08,0) E2(5.08,1.27) E3(5.08,2.54) E4(5.08,3.81) E23(5.08,27.94) E24(5.08,29.21) E25(5.08,30.48) E26(5.08,31.75) F1(6.35,0) F2(6.35,1.27) F3(6.35,2.54) F4(6.35,3.81) F23(6.35,27.94) F24(6.35,29.21) F25(6.35,30.48) F26(6.35,31.75) G1(7.62,0) G2(7.62,1.27) G3(7.62,2.54) G4(7.62,3.81) G23(7.62,27.94) G24(7.62,29.21) G25(7.62,30.48) G26(7.62,31.75) H1(8.89,0) H2(8.89,1.27) H3(8.89,2.54) H4(8.89,3.81) H23(8.89,27.94) H24(8.89,29.21) H25(8.89,30.48) H26(8.89,31.75) J1(10.16,0) J2(10.16,1.27) J3(10.16,2.54) J4(10.16,3.81) J23(10.16,27.94) J24(10.16,29.21) J25(10.16,30.48) J26(10.16,31.75) K1(11.43,0) K2(11.43,1.27) K3(11.43,2.54) K4(11.43,3.81) K10(11.43,11.43) K11(11.43,12.7) K12(11.43,13.97) K13(11.43,15.24) K14(11.43,16.51) K15(11.43,17.78) K16(11.43,19.05) K17(11.43,20.32) K23(11.43,27.94) K24(11.43,29.21) K25(11.43,30.48) K26(11.43,31.75) L1(12.7,0) L2(12.7,1.27) L3(12.7,2.54) L4(12.7,3.81) L10(12.7,11.43) L11(12.7,12.7) L12(12.7,13.97) L13(12.7,15.24) L14(12.7,16.51) L15(12.7,17.78) L16(12.7,19.05) L17(12.7,20.32) L23(12.7,27.94) L24(12.7,29.21) L25(12.7,30.48) L26(12.7,31.75) M1(13.97,0) M2(13.97,1.27) M3(13.97,2.54) M4(13.97,3.81) M10(13.97,11.43) M11(13.97,12.7) M12(13.97,13.97) M13(13.97,15.24) M14(13.97,16.51) M15(13.97,17.78) M16(13.97,19.05) M17(13.97,20.32) M23(13.97,27.94) M24(13.97,29.21) M25(13.97,30.48) M26(13.97,31.75) N1(15.24,0) N2(15.24,1.27) N3(15.24,2.54) N4(15.24,3.81) N10(15.24,11.43) N11(15.24,12.7) N12(15.24,13.97) N13(15.24,15.24) N14(15.24,16.51) N15(15.24,17.78) N16(15.24,19.05) N17(15.24,20.32) N23(15.24,27.94) N24(15.24,29.21) N25(15.24,30.48) N26(15.24,31.75) P1(16.51,0) P2(16.51,1.27) P3(16.51,2.54) P4(16.51,3.81) P10(16.51,11.43) P11(16.51,12.7) P12(16.51,13.97) P13(16.51,15.24) P14(16.51,16.51) P15(16.51,17.78) P16(16.51,19.05) P17(16.51,20.32) P23(16.51,27.94) P24(16.51,29.21) P25(16.51,30.48) P26(16.51,31.75) R1(17.78,0) R2(17.78,1.27) R3(17.78,2.54) R4(17.78,3.81) R10(17.78,11.43) R11(17.78,12.7) R12(17.78,13.97) R13(17.78,15.24) R14(17.78,16.51) R15(17.78,17.78) R16(17.78,19.05) R17(17.78,20.32) R23(17.78,27.94) R24(17.78,29.21) R25(17.78,30.48) R26(17.78,31.75) T1(19.05,0) T2(19.05,1.27) T3(19.05,2.54) T4(19.05,3.81) T10(19.05,11.43) T11(19.05,12.7) T12(19.05,13.97) T13(19.05,15.24) T14(19.05,16.51) T15(19.05,17.78) T16(19.05,19.05) T17(19.05,20.32) T23(19.05,27.94) T24(19.05,29.21) T25(19.05,30.48) T26(19.05,31.75) U1(20.32,0) U2(20.32,1.27) U3(20.32,2.54) U4(20.32,3.81) U10(20.32,11.43) U11(20.32,12.7) U12(20.32,13.97) U13(20.32,15.24) U14(20.32,16.51) U15(20.32,17.78) U16(20.32,19.05) U17(20.32,20.32) U23(20.32,27.94) U24(20.32,29.21) U25(20.32,30.48) U26(20.32,31.75) V1(21.59,0) V2(21.59,1.27) V3(21.59,2.54) V4(21.59,3.81) V23(21.59,27.94) V24(21.59,29.21) V25(21.59,30.48) V26(21.59,31.75) W1(22.86,0) W2(22.86,1.27) W3(22.86,2.54) W4(22.86,3.81) W23(22.86,27.94) W24(22.86,29.21) W25(22.86,30.48) W26(22.86,31.75) Y1(24.13,0) Y2(24.13,1.27) Y3(24.13,2.54) Y4(24.13,3.81) Y23(24.13,27.94) Y24(24.13,29.21) Y25(24.13,30.48) Y26(24.13,31.75)
Top Overlay:
  lines w0.3: -1.905,-0.635 -1.905,33.655 33.655,33.655 33.655,-1.905 -0.635,-1.905 -1.905,-0.635
Mechanical 1:
  lines w0.2: -1.905,-0.635 -0.635,-1.905 33.655,-1.905 33.655,33.655 -1.905,33.655 -1.905,-0.635
  text ".Comment" at 12,13.7 h1.5
  text "A" at -0.5,32.5 h1.5
  text ".Designator" at 14.2,16.1 h1.5
  text "B" at 0.8,32.5 h1.5
  text "C" at 2.1,32.5 h1.5
  text "D" at 3.4,32.5 h1.5
  text "E" at 4.6,32.5 h1.5
  text "F" at 5.9,32.5 h1.5
  text "G" at 7.1,32.5 h1.5
  text "H" at 8.4,32.5 h1.5
  text "J" at 9.9,32.5 h1.5
  text "K" at 10.9,32.5 h1.5
  text "L" at 12.3,32.5 h1.5
  text "M" at 13.5,32.5 h1.5
  text "N" at 14.8,32.5 h1.5
  text "P" at 16.2,32.5 h1.5
  text "R" at 17.3,32.5 h1.5
  text "T" at 18.7,32.5 h1.5
  text "U" at 19.8,32.5 h1.5
  text "V" at 21.1,32.5 h1.5
  text "W" at 22.3,32.5 h1.5
  text "Y" at 23.6,32.5 h1.5
  text "Aa" at 24.8,32.5 h1.2
  text "Ab" at 26.1,32.5 h1.2
  text "Ac" at 27.37,32.5 h1.2
  text "Ad" at 28.64,32.5 h1.2
  text "Ae" at 29.91,32.5 h1.2
  text "Af" at 31.18,32.5 h1.2
  text "26" at -1.5,31.4 h1.5
  text "25" at -1.5,30.13 h1.5
  text "24" at -1.5,28.86 h1.5
  text "23" at -1.5,27.59 h1.5
  text "22" at -1.5,26.35 h1.5
  text "21" at -1.5,25.05 h1.5
  text "20" at -1.5,23.78 h1.5
  text "19" at -1.5,22.51 h1.5
  text "18" at -1.5,21.24 h1.5
  text "17" at -1.5,19.97 h1.5
  text "16" at -1.5,18.7 h1.5
  text "15" at -1.5,17.43 h1.5
  text "14" at -1.5,16.16 h1.5
  text "13" at -1.5,14.89 h1.5
  text "12" at -1.5,13.62 h1.5
  text "11" at -1.5,12.35 h1.5
  text "10" at -1.5,11.08 h1.5
  text "9" at -1.5,9.81 h1.5
  text "8" at -1.5,8.54 h1.5
  text "7" at -1.5,7.27 h1.5
  text "6" at -1.5,6 h1.5
  text "5" at -1.5,4.73 h1.5
  text "4" at -1.5,3.46 h1.5
  text "3" at -1.5,2.19 h1.5
  text "2" at -1.5,0.92 h1.5
  text "1" at -1.5,-0.35 h1.5